# Altium schematic symbol library jlcpcb_2025_04_capacitors_extended_0603.schlib: 3668 symbols (part 16 of 20)
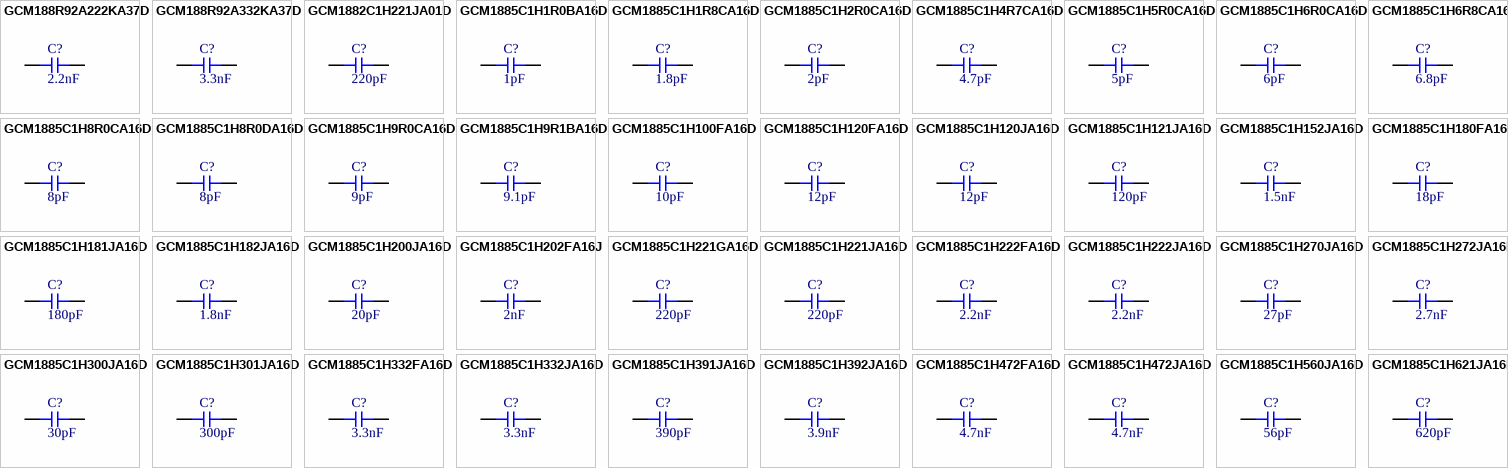
[diagram p106: symbols GCM188R92A222KA37D to GCM1885C1H621JA16D]

## GCM1885C1H152JA16D
designator C?  Capacitance: 1.5nF  (hidden comment: *)
Capacitor, Ceramic (MLCC), 1.5nF, ±5%, 50V, C0G, ±5%, SMD 0603; Manufacturer: Murata Electronics; Manufacturer Part Number: GCM1885C1H152JA16D; Package Size: 0603; JLCPCB Basic Part: No; JLCPCB Part Number: C161174; Supplier 1: LCSC; Category: Capacitors - MLCC; Supplier Part Number 1: C161174; Tolerance: ±5%; Voltage Rating: 50V; Temperature Coefficient: C0G; RoHS: Yes; ComponentLink1Description: Datasheet; ComponentLink1URL: https://wmsc.lcsc.com/wmsc/upload/file/pdf/v2/lcsc/1810311136_Murata-Electronics-GCM1885C1H152JA16D_C161174.pdf; ComponentLink2Description: JLCPCB Part URL; ComponentLink2URL: https://jlcpcb.com/partdetail/C161174; ComponentLink3Description: LCSC Part URL; ComponentLink3URL: https://lcsc.com/product-detail/Multilayer-Ceramic-Capacitors-MLCC---SMD-SMT_Murata-Electronics-Murata-Electronics-GCM1885C1H152JA16D_C161174.html
footprint CAP-0603 (0603 (1608M) Capacitor)
pins: 1, 2

## GCM1885C1H180FA16D
designator C?  Capacitance: 18pF  (hidden comment: *)
Capacitor, Ceramic (MLCC), 18pF, ±1%, 50V, C0G, ±1%, SMD 0603; Manufacturer: Murata Electronics; Manufacturer Part Number: GCM1885C1H180FA16D; Package Size: 0603; JLCPCB Basic Part: No; JLCPCB Part Number: C126551; Supplier 1: LCSC; Category: Capacitors - MLCC; Supplier Part Number 1: C126551; Tolerance: ±1%; Voltage Rating: 50V; Temperature Coefficient: C0G; RoHS: Yes; ComponentLink1Description: Datasheet; ComponentLink1URL: https://wmsc.lcsc.com/wmsc/upload/file/pdf/v2/lcsc/1810311141_Murata-Electronics-GCM1885C1H180FA16D_C126551.pdf; ComponentLink2Description: JLCPCB Part URL; ComponentLink2URL: https://jlcpcb.com/partdetail/C126551; ComponentLink3Description: LCSC Part URL; ComponentLink3URL: https://lcsc.com/product-detail/Multilayer-Ceramic-Capacitors-MLCC---SMD-SMT_Murata-Electronics-Murata-Electronics-GCM1885C1H180FA16D_C126551.html
footprint CAP-0603 (0603 (1608M) Capacitor)
pins: 1, 2

## GCM1885C1H181JA16D
designator C?  Capacitance: 180pF  (hidden comment: *)
Capacitor, Ceramic (MLCC), 180pF, ±5%, 50V, C0G, ±5%, SMD 0603; Manufacturer: Murata Electronics; Manufacturer Part Number: GCM1885C1H181JA16D; Package Size: 0603; JLCPCB Basic Part: No; JLCPCB Part Number: C440147; Supplier 1: LCSC; Category: Capacitors - MLCC; Supplier Part Number 1: C440147; Tolerance: ±5%; Voltage Rating: 50V; Temperature Coefficient: C0G; RoHS: Yes; ComponentLink1Description: Datasheet; ComponentLink1URL: https://wmsc.lcsc.com/wmsc/upload/file/pdf/v2/lcsc/2304140030_Murata-Electronics-GCM1885C1H181JA16D_C440147.pdf; ComponentLink2Description: JLCPCB Part URL; ComponentLink2URL: https://jlcpcb.com/partdetail/C440147; ComponentLink3Description: LCSC Part URL; ComponentLink3URL: https://lcsc.com/product-detail/Multilayer-Ceramic-Capacitors-MLCC---SMD-SMT_Murata-Electronics-Murata-Electronics-GCM1885C1H181JA16D_C440147.html
footprint CAP-0603 (0603 (1608M) Capacitor)
pins: 1, 2

## GCM1885C1H182JA16D
designator C?  Capacitance: 1.8nF  (hidden comment: *)
Capacitor, Ceramic (MLCC), 1.8nF, ±5%, 50V, C0G, ±5%, SMD 0603; Manufacturer: Murata Electronics; Manufacturer Part Number: GCM1885C1H182JA16D; Package Size: 0603; JLCPCB Basic Part: No; JLCPCB Part Number: C437450; Supplier 1: LCSC; Category: Capacitors - MLCC; Supplier Part Number 1: C437450; Tolerance: ±5%; Voltage Rating: 50V; Temperature Coefficient: C0G; RoHS: Yes; ComponentLink1Description: Datasheet; ComponentLink1URL: https://wmsc.lcsc.com/wmsc/upload/file/pdf/v2/lcsc/2304140030_Murata-Electronics-GCM1885C1H182JA16D_C437450.pdf; ComponentLink2Description: JLCPCB Part URL; ComponentLink2URL: https://jlcpcb.com/partdetail/C437450; ComponentLink3Description: LCSC Part URL; ComponentLink3URL: https://lcsc.com/product-detail/Multilayer-Ceramic-Capacitors-MLCC---SMD-SMT_Murata-Electronics-Murata-Electronics-GCM1885C1H182JA16D_C437450.html
footprint CAP-0603 (0603 (1608M) Capacitor)
pins: 1, 2

## GCM1885C1H200JA16D
designator C?  Capacitance: 20pF  (hidden comment: *)
Capacitor, Ceramic (MLCC), 20pF, ±5%, 50V, C0G, ±5%, SMD 0603; Manufacturer: Murata Electronics; Manufacturer Part Number: GCM1885C1H200JA16D; Package Size: 0603; JLCPCB Basic Part: No; JLCPCB Part Number: C126554; Supplier 1: LCSC; Category: Capacitors - MLCC; Supplier Part Number 1: C126554; Tolerance: ±5%; Voltage Rating: 50V; Temperature Coefficient: C0G; RoHS: Yes; ComponentLink1Description: Datasheet; ComponentLink1URL: https://wmsc.lcsc.com/wmsc/upload/file/pdf/v2/lcsc/1810311120_Murata-Electronics-GCM1885C1H200JA16D_C126554.pdf; ComponentLink2Description: JLCPCB Part URL; ComponentLink2URL: https://jlcpcb.com/partdetail/C126554; ComponentLink3Description: LCSC Part URL; ComponentLink3URL: https://lcsc.com/product-detail/Multilayer-Ceramic-Capacitors-MLCC---SMD-SMT_Murata-Electronics-Murata-Electronics-GCM1885C1H200JA16D_C126554.html
footprint CAP-0603 (0603 (1608M) Capacitor)
pins: 1, 2

## GCM1885C1H202FA16J
designator C?  Capacitance: 2nF  (hidden comment: *)
Capacitor, Ceramic (MLCC), 2nF, ±1%, 50V, C0G, ±1%, SMD 0603; Manufacturer: Murata Electronics; Manufacturer Part Number: GCM1885C1H202FA16J; Package Size: 0603; JLCPCB Basic Part: No; JLCPCB Part Number: C1870141; Supplier 1: LCSC; Category: Capacitors - MLCC; Supplier Part Number 1: C1870141; Tolerance: ±1%; Voltage Rating: 50V; Temperature Coefficient: C0G; RoHS: Yes; ComponentLink1Description: Datasheet; ComponentLink1URL: https://wmsc.lcsc.com/wmsc/upload/file/pdf/v2/lcsc/2201272330_Murata-Electronics-GCM1885C1H202FA16J_C1870141.pdf; ComponentLink2Description: JLCPCB Part URL; ComponentLink2URL: https://jlcpcb.com/partdetail/C1870141; ComponentLink3Description: LCSC Part URL; ComponentLink3URL: https://lcsc.com/product-detail/Multilayer-Ceramic-Capacitors-MLCC---SMD-SMT_Murata-Electronics-Murata-Electronics-GCM1885C1H202FA16J_C1870141.html
footprint CAP-0603 (0603 (1608M) Capacitor)
pins: 1, 2

## GCM1885C1H221GA16D
designator C?  Capacitance: 220pF  (hidden comment: *)
Capacitor, Ceramic (MLCC), 220pF, ±2%, 50V, C0G, ±2%, SMD 0603; Manufacturer: Murata Electronics; Manufacturer Part Number: GCM1885C1H221GA16D; Package Size: 0603; JLCPCB Basic Part: No; JLCPCB Part Number: C437452; Supplier 1: LCSC; Category: Capacitors - MLCC; Supplier Part Number 1: C437452; Tolerance: ±2%; Voltage Rating: 50V; Temperature Coefficient: C0G; RoHS: Yes; ComponentLink1Description: Datasheet; ComponentLink1URL: https://wmsc.lcsc.com/wmsc/upload/file/pdf/v2/lcsc/2304140030_Murata-Electronics-GCM1885C1H221GA16D_C437452.pdf; ComponentLink2Description: JLCPCB Part URL; ComponentLink2URL: https://jlcpcb.com/partdetail/C437452; ComponentLink3Description: LCSC Part URL; ComponentLink3URL: https://lcsc.com/product-detail/Multilayer-Ceramic-Capacitors-MLCC---SMD-SMT_Murata-Electronics-Murata-Electronics-GCM1885C1H221GA16D_C437452.html
footprint CAP-0603 (0603 (1608M) Capacitor)
pins: 1, 2

## GCM1885C1H221JA16D
designator C?  Capacitance: 220pF  (hidden comment: *)
Capacitor, Ceramic (MLCC), 220pF, ±5%, 50V, C0G, ±5%, SMD 0603; Manufacturer: Murata Electronics; Manufacturer Part Number: GCM1885C1H221JA16D; Package Size: 0603; JLCPCB Basic Part: No; JLCPCB Part Number: C126556; Supplier 1: LCSC; Category: Capacitors - MLCC; Supplier Part Number 1: C126556; Tolerance: ±5%; Voltage Rating: 50V; Temperature Coefficient: C0G; RoHS: Yes; ComponentLink1Description: Datasheet; ComponentLink1URL: https://wmsc.lcsc.com/wmsc/upload/file/pdf/v2/lcsc/1810311134_Murata-Electronics-GCM1885C1H221JA16D_C126556.pdf; ComponentLink2Description: JLCPCB Part URL; ComponentLink2URL: https://jlcpcb.com/partdetail/C126556; ComponentLink3Description: LCSC Part URL; ComponentLink3URL: https://lcsc.com/product-detail/Multilayer-Ceramic-Capacitors-MLCC---SMD-SMT_Murata-Electronics-Murata-Electronics-GCM1885C1H221JA16D_C126556.html
footprint CAP-0603 (0603 (1608M) Capacitor)
pins: 1, 2

## GCM1885C1H222FA16D
designator C?  Capacitance: 2.2nF  (hidden comment: *)
Capacitor, Ceramic (MLCC), 2.2nF, ±1%, null, ±1%, SMD 0603; Manufacturer: Murata Electronics; Manufacturer Part Number: GCM1885C1H222FA16D; Package Size: 0603; JLCPCB Basic Part: No; JLCPCB Part Number: C882578; Supplier 1: LCSC; Category: Capacitors - MLCC; Supplier Part Number 1: C882578; Tolerance: ±1%; Voltage Rating: null; RoHS: Yes; ComponentLink1Description: Datasheet; ComponentLink1URL: https://wmsc.lcsc.com/wmsc/upload/file/pdf/v2/lcsc/2201242130_Murata-Electronics-GCM1885C1H222FA16D_C882578.pdf; ComponentLink2Description: JLCPCB Part URL; ComponentLink2URL: https://jlcpcb.com/partdetail/C882578; ComponentLink3Description: LCSC Part URL; ComponentLink3URL: https://lcsc.com/product-detail/Multilayer-Ceramic-Capacitors-MLCC---SMD-SMT_Murata-Electronics-Murata-Electronics-GCM1885C1H222FA16D_C882578.html
footprint CAP-0603 (0603 (1608M) Capacitor)
pins: 1, 2

## GCM1885C1H222JA16D
designator C?  Capacitance: 2.2nF  (hidden comment: *)
Capacitor, Ceramic (MLCC), 2.2nF, ±5%, 50V, C0G, ±5%, SMD 0603; Manufacturer: Murata Electronics; Manufacturer Part Number: GCM1885C1H222JA16D; Package Size: 0603; JLCPCB Basic Part: No; JLCPCB Part Number: C343869; Supplier 1: LCSC; Category: Capacitors - MLCC; Supplier Part Number 1: C343869; Tolerance: ±5%; Voltage Rating: 50V; Temperature Coefficient: C0G; RoHS: Yes; ComponentLink1Description: Datasheet; ComponentLink1URL: https://wmsc.lcsc.com/wmsc/upload/file/pdf/v2/lcsc/1912111437_Murata-Electronics-GCM1885C1H222JA16D_C343869.pdf; ComponentLink2Description: JLCPCB Part URL; ComponentLink2URL: https://jlcpcb.com/partdetail/C343869; ComponentLink3Description: LCSC Part URL; ComponentLink3URL: https://lcsc.com/product-detail/Multilayer-Ceramic-Capacitors-MLCC---SMD-SMT_Murata-Electronics-Murata-Electronics-GCM1885C1H222JA16D_C343869.html
footprint CAP-0603 (0603 (1608M) Capacitor)
pins: 1, 2

## GCM1885C1H270JA16D
designator C?  Capacitance: 27pF  (hidden comment: *)
Capacitor, Ceramic (MLCC), 27pF, ±5%, 50V, C0G, ±5%, SMD 0603; Manufacturer: Murata Electronics; Manufacturer Part Number: GCM1885C1H270JA16D; Package Size: 0603; JLCPCB Basic Part: No; JLCPCB Part Number: C126558; Supplier 1: LCSC; Category: Capacitors - MLCC; Supplier Part Number 1: C126558; Tolerance: ±5%; Voltage Rating: 50V; Temperature Coefficient: C0G; RoHS: Yes; ComponentLink1Description: Datasheet; ComponentLink1URL: https://wmsc.lcsc.com/wmsc/upload/file/pdf/v2/lcsc/1810311141_Murata-Electronics-GCM1885C1H270JA16D_C126558.pdf; ComponentLink2Description: JLCPCB Part URL; ComponentLink2URL: https://jlcpcb.com/partdetail/C126558; ComponentLink3Description: LCSC Part URL; ComponentLink3URL: https://lcsc.com/product-detail/Multilayer-Ceramic-Capacitors-MLCC---SMD-SMT_Murata-Electronics-Murata-Electronics-GCM1885C1H270JA16D_C126558.html
footprint CAP-0603 (0603 (1608M) Capacitor)
pins: 1, 2

## GCM1885C1H272JA16D
designator C?  Capacitance: 2.7nF  (hidden comment: *)
Capacitor, Ceramic (MLCC), 2.7nF, ±5%, 50V, C0G, ±5%, SMD 0603; Manufacturer: Murata Electronics; Manufacturer Part Number: GCM1885C1H272JA16D; Package Size: 0603; JLCPCB Basic Part: No; JLCPCB Part Number: C437453; Supplier 1: LCSC; Category: Capacitors - MLCC; Supplier Part Number 1: C437453; Tolerance: ±5%; Voltage Rating: 50V; Temperature Coefficient: C0G; RoHS: Yes; ComponentLink1Description: Datasheet; ComponentLink1URL: https://wmsc.lcsc.com/wmsc/upload/file/pdf/v2/lcsc/2304140030_Murata-Electronics-GCM1885C1H272JA16D_C437453.pdf; ComponentLink2Description: JLCPCB Part URL; ComponentLink2URL: https://jlcpcb.com/partdetail/C437453; ComponentLink3Description: LCSC Part URL; ComponentLink3URL: https://lcsc.com/product-detail/Multilayer-Ceramic-Capacitors-MLCC---SMD-SMT_Murata-Electronics-Murata-Electronics-GCM1885C1H272JA16D_C437453.html
footprint CAP-0603 (0603 (1608M) Capacitor)
pins: 1, 2

## GCM1885C1H300JA16D
designator C?  Capacitance: 30pF  (hidden comment: *)
Capacitor, Ceramic (MLCC), 30pF, ±5%, 50V, C0G, ±5%, SMD 0603; Manufacturer: Murata Electronics; Manufacturer Part Number: GCM1885C1H300JA16D; Package Size: 0603; JLCPCB Basic Part: No; JLCPCB Part Number: C425878; Supplier 1: LCSC; Category: Capacitors - MLCC; Supplier Part Number 1: C425878; Tolerance: ±5%; Voltage Rating: 50V; Temperature Coefficient: C0G; RoHS: Yes; ComponentLink1Description: Datasheet; ComponentLink1URL: https://wmsc.lcsc.com/wmsc/upload/file/pdf/v2/lcsc/1912111437_Murata-Electronics-GCM1885C1H300JA16D_C425878.pdf; ComponentLink2Description: JLCPCB Part URL; ComponentLink2URL: https://jlcpcb.com/partdetail/C425878; ComponentLink3Description: LCSC Part URL; ComponentLink3URL: https://lcsc.com/product-detail/Multilayer-Ceramic-Capacitors-MLCC---SMD-SMT_Murata-Electronics-Murata-Electronics-GCM1885C1H300JA16D_C425878.html
footprint CAP-0603 (0603 (1608M) Capacitor)
pins: 1, 2

## GCM1885C1H301JA16D
designator C?  Capacitance: 300pF  (hidden comment: *)
Capacitor, Ceramic (MLCC), 300pF, ±5%, null, ±5%, SMD 0603; Manufacturer: Murata Electronics; Manufacturer Part Number: GCM1885C1H301JA16D; Package Size: 0603; JLCPCB Basic Part: No; JLCPCB Part Number: C913766; Supplier 1: LCSC; Category: Capacitors - MLCC; Supplier Part Number 1: C913766; Tolerance: ±5%; Voltage Rating: null; RoHS: Yes; ComponentLink1Description: Datasheet; ComponentLink1URL: https://wmsc.lcsc.com/wmsc/upload/file/pdf/v2/lcsc/2308111602_Murata-Electronics-GCM1885C1H301JA16D_C913766.pdf; ComponentLink2Description: JLCPCB Part URL; ComponentLink2URL: https://jlcpcb.com/partdetail/C913766; ComponentLink3Description: LCSC Part URL; ComponentLink3URL: https://lcsc.com/product-detail/Multilayer-Ceramic-Capacitors-MLCC---SMD-SMT_Murata-Electronics-Murata-Electronics-GCM1885C1H301JA16D_C913766.html
footprint CAP-0603 (0603 (1608M) Capacitor)
pins: 1, 2

## GCM1885C1H332FA16D
designator C?  Capacitance: 3.3nF  (hidden comment: *)
Capacitor, Ceramic (MLCC), 3.3nF, 50V, C0G, SMD 0603; Manufacturer: Murata Electronics; Manufacturer Part Number: GCM1885C1H332FA16D; Package Size: 0603; JLCPCB Basic Part: No; JLCPCB Part Number: C3877267; Supplier 1: LCSC; Category: Capacitors - MLCC; Supplier Part Number 1: C3877267; Voltage Rating: 50V; Temperature Coefficient: C0G; RoHS: Yes; ComponentLink1Description: Datasheet; ComponentLink1URL: https://wmsc.lcsc.com/wmsc/upload/file/pdf/v2/lcsc/2308111756_Murata-Electronics-GCM1885C1H332FA16D_C3877267.pdf; ComponentLink2Description: JLCPCB Part URL; ComponentLink2URL: https://jlcpcb.com/partdetail/C3877267; ComponentLink3Description: LCSC Part URL; ComponentLink3URL: https://lcsc.com/product-detail/Multilayer-Ceramic-Capacitors-MLCC---SMD-SMT_Murata-Electronics-Murata-Electronics-GCM1885C1H332FA16D_C3877267.html
footprint CAP-0603 (0603 (1608M) Capacitor)
pins: 1, 2

## GCM1885C1H332JA16D
designator C?  Capacitance: 3.3nF  (hidden comment: *)
Capacitor, Ceramic (MLCC), 3.3nF, ±5%, 50V, C0G, ±5%, SMD 0603; Manufacturer: Murata Electronics; Manufacturer Part Number: GCM1885C1H332JA16D; Package Size: 0603; JLCPCB Basic Part: No; JLCPCB Part Number: C161178; Supplier 1: LCSC; Category: Capacitors - MLCC; Supplier Part Number 1: C161178; Tolerance: ±5%; Voltage Rating: 50V; Temperature Coefficient: C0G; RoHS: Yes; ComponentLink1Description: Datasheet; ComponentLink1URL: https://wmsc.lcsc.com/wmsc/upload/file/pdf/v2/lcsc/1810311133_Murata-Electronics-GCM1885C1H332JA16D_C161178.pdf; ComponentLink2Description: JLCPCB Part URL; ComponentLink2URL: https://jlcpcb.com/partdetail/C161178; ComponentLink3Description: LCSC Part URL; ComponentLink3URL: https://lcsc.com/product-detail/Multilayer-Ceramic-Capacitors-MLCC---SMD-SMT_Murata-Electronics-Murata-Electronics-GCM1885C1H332JA16D_C161178.html
footprint CAP-0603 (0603 (1608M) Capacitor)
pins: 1, 2

## GCM1885C1H391JA16D
designator C?  Capacitance: 390pF  (hidden comment: *)
Capacitor, Ceramic (MLCC), 390pF, ±5%, 50V, ±5%, SMD 0603; Manufacturer: Murata Electronics; Manufacturer Part Number: GCM1885C1H391JA16D; Package Size: 0603; JLCPCB Basic Part: No; JLCPCB Part Number: C126564; Supplier 1: LCSC; Category: Capacitors - MLCC; Supplier Part Number 1: C126564; Tolerance: ±5%; Voltage Rating: 50V; RoHS: Yes; ComponentLink1Description: Datasheet; ComponentLink1URL: https://wmsc.lcsc.com/wmsc/upload/file/pdf/v2/lcsc/2201242300_Murata-Electronics-GCM1885C1H391JA16D_C126564.pdf; ComponentLink2Description: JLCPCB Part URL; ComponentLink2URL: https://jlcpcb.com/partdetail/C126564; ComponentLink3Description: LCSC Part URL; ComponentLink3URL: https://lcsc.com/product-detail/Multilayer-Ceramic-Capacitors-MLCC---SMD-SMT_Murata-Electronics-Murata-Electronics-GCM1885C1H391JA16D_C126564.html
footprint CAP-0603 (0603 (1608M) Capacitor)
pins: 1, 2

## GCM1885C1H392JA16D
designator C?  Capacitance: 3.9nF  (hidden comment: *)
Capacitor, Ceramic (MLCC), 3.9nF, ±5%, 50V, ±5%, SMD 0603; Manufacturer: Murata Electronics; Manufacturer Part Number: GCM1885C1H392JA16D; Package Size: 0603; JLCPCB Basic Part: No; JLCPCB Part Number: C2169349; Supplier 1: LCSC; Category: Capacitors - MLCC; Supplier Part Number 1: C2169349; Tolerance: ±5%; Voltage Rating: 50V; RoHS: Yes; ComponentLink1Description: Datasheet; ComponentLink1URL: https://wmsc.lcsc.com/wmsc/upload/file/pdf/v2/lcsc/2308111602_Murata-Electronics-GCM1885C1H392JA16D_C2169349.pdf; ComponentLink2Description: JLCPCB Part URL; ComponentLink2URL: https://jlcpcb.com/partdetail/C2169349; ComponentLink3Description: LCSC Part URL; ComponentLink3URL: https://lcsc.com/product-detail/Multilayer-Ceramic-Capacitors-MLCC---SMD-SMT_Murata-Electronics-Murata-Electronics-GCM1885C1H392JA16D_C2169349.html
footprint CAP-0603 (0603 (1608M) Capacitor)
pins: 1, 2

## GCM1885C1H472FA16D
designator C?  Capacitance: 4.7nF  (hidden comment: *)
Capacitor, Ceramic (MLCC), 4.7nF, ±1%, ±1%, SMD 0603; Manufacturer: Murata Electronics; Manufacturer Part Number: GCM1885C1H472FA16D; Package Size: 0603; JLCPCB Basic Part: No; JLCPCB Part Number: C883564; Supplier 1: LCSC; Category: Capacitors - MLCC; Supplier Part Number 1: C883564; Tolerance: ±1%; RoHS: Yes; ComponentLink1Description: Datasheet; ComponentLink1URL: https://wmsc.lcsc.com/wmsc/upload/file/pdf/v2/lcsc/2304140030_Murata-Electronics-GCM1885C1H472FA16D_C883564.pdf; ComponentLink2Description: JLCPCB Part URL; ComponentLink2URL: https://jlcpcb.com/partdetail/C883564; ComponentLink3Description: LCSC Part URL; ComponentLink3URL: https://lcsc.com/product-detail/Multilayer-Ceramic-Capacitors-MLCC---SMD-SMT_Murata-Electronics-Murata-Electronics-GCM1885C1H472FA16D_C883564.html
footprint CAP-0603 (0603 (1608M) Capacitor)
pins: 1, 2

## GCM1885C1H472JA16D
designator C?  Capacitance: 4.7nF  (hidden comment: *)
Capacitor, Ceramic (MLCC), 4.7nF, ±5%, 50V, C0G, ±5%, SMD 0603; Manufacturer: Murata Electronics; Manufacturer Part Number: GCM1885C1H472JA16D; Package Size: 0603; JLCPCB Basic Part: No; JLCPCB Part Number: C343870; Supplier 1: LCSC; Category: Capacitors - MLCC; Supplier Part Number 1: C343870; Tolerance: ±5%; Voltage Rating: 50V; Temperature Coefficient: C0G; RoHS: Yes; ComponentLink1Description: Datasheet; ComponentLink1URL: https://wmsc.lcsc.com/wmsc/upload/file/pdf/v2/lcsc/2208111730_Murata-Electronics-GCM1885C1H472JA16D_C343870.pdf; ComponentLink2Description: JLCPCB Part URL; ComponentLink2URL: https://jlcpcb.com/partdetail/C343870; ComponentLink3Description: LCSC Part URL; ComponentLink3URL: https://lcsc.com/product-detail/Multilayer-Ceramic-Capacitors-MLCC---SMD-SMT_Murata-Electronics-Murata-Electronics-GCM1885C1H472JA16D_C343870.html
footprint CAP-0603 (0603 (1608M) Capacitor)
pins: 1, 2

## GCM1885C1H560JA16D
designator C?  Capacitance: 56pF  (hidden comment: *)
Capacitor, Ceramic (MLCC), 56pF, ±5%, 50V, C0G, ±5%, SMD 0603; Manufacturer: Murata Electronics; Manufacturer Part Number: GCM1885C1H560JA16D; Package Size: 0603; JLCPCB Basic Part: No; JLCPCB Part Number: C126568; Supplier 1: LCSC; Category: Capacitors - MLCC; Supplier Part Number 1: C126568; Tolerance: ±5%; Voltage Rating: 50V; Temperature Coefficient: C0G; RoHS: Yes; ComponentLink1Description: Datasheet; ComponentLink1URL: https://wmsc.lcsc.com/wmsc/upload/file/pdf/v2/lcsc/1912111437_Murata-Electronics-GCM1885C1H560JA16D_C126568.pdf; ComponentLink2Description: JLCPCB Part URL; ComponentLink2URL: https://jlcpcb.com/partdetail/C126568; ComponentLink3Description: LCSC Part URL; ComponentLink3URL: https://lcsc.com/product-detail/Multilayer-Ceramic-Capacitors-MLCC---SMD-SMT_Murata-Electronics-Murata-Electronics-GCM1885C1H560JA16D_C126568.html
footprint CAP-0603 (0603 (1608M) Capacitor)
pins: 1, 2

## GCM1885C1H621JA16D
designator C?  Capacitance: 620pF  (hidden comment: *)
Capacitor, Ceramic (MLCC), 620pF, ±5%, 50V, C0G, ±5%, SMD 0603; Manufacturer: Murata Electronics; Manufacturer Part Number: GCM1885C1H621JA16D; Package Size: 0603; JLCPCB Basic Part: No; JLCPCB Part Number: C126569; Supplier 1: LCSC; Category: Capacitors - MLCC; Supplier Part Number 1: C126569; Tolerance: ±5%; Voltage Rating: 50V; Temperature Coefficient: C0G; RoHS: Yes; ComponentLink1Description: Datasheet; ComponentLink1URL: https://wmsc.lcsc.com/wmsc/upload/file/pdf/v2/lcsc/1811141813_Murata-Electronics-GCM1885C1H621JA16D_C126569.pdf; ComponentLink2Description: JLCPCB Part URL; ComponentLink2URL: https://jlcpcb.com/partdetail/C126569; ComponentLink3Description: LCSC Part URL; ComponentLink3URL: https://lcsc.com/product-detail/Multilayer-Ceramic-Capacitors-MLCC---SMD-SMT_Murata-Electronics-Murata-Electronics-GCM1885C1H621JA16D_C126569.html
footprint CAP-0603 (0603 (1608M) Capacitor)
pins: 1, 2

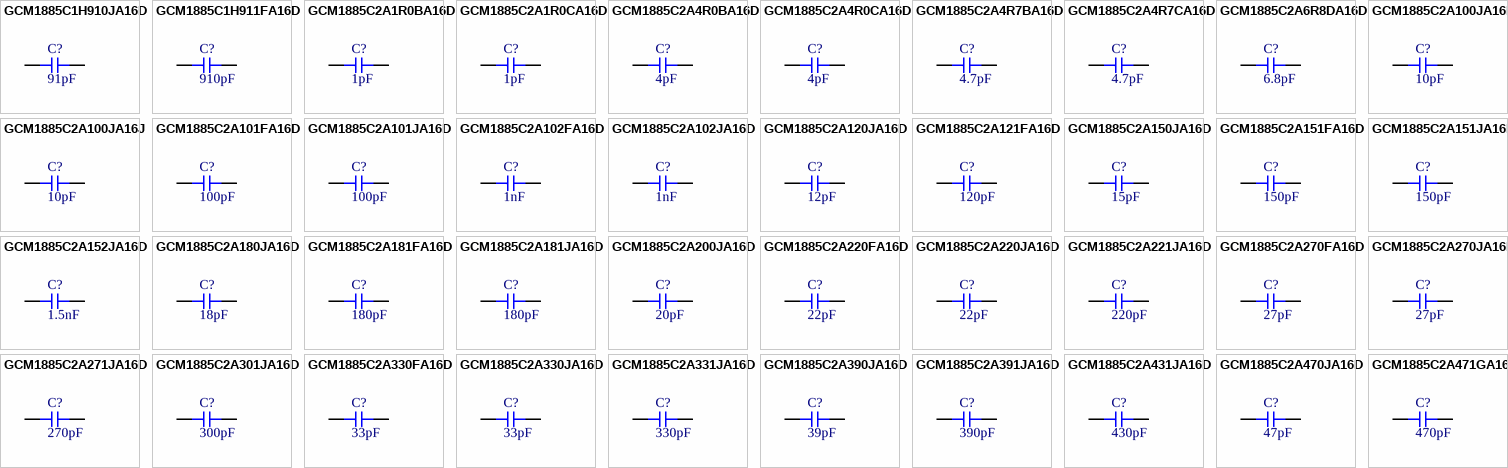
[diagram p70: symbols GCM1885C1H910JA16D to GCM1885C2A471GA16D]

## GCM1885C1H910JA16D
designator C?  Capacitance: 91pF  (hidden comment: *)
Capacitor, Ceramic (MLCC), 91pF, ±5%, null, ±5%, SMD 0603; Manufacturer: Murata Electronics; Manufacturer Part Number: GCM1885C1H910JA16D; Package Size: 0603; JLCPCB Basic Part: No; JLCPCB Part Number: C782042; Supplier 1: LCSC; Category: Capacitors - MLCC; Supplier Part Number 1: C782042; Tolerance: ±5%; Voltage Rating: null; RoHS: Yes; ComponentLink1Description: Datasheet; ComponentLink1URL: https://wmsc.lcsc.com/wmsc/upload/file/pdf/v2/lcsc/2304140030_Murata-Electronics-GCM1885C1H910JA16D_C782042.pdf; ComponentLink2Description: JLCPCB Part URL; ComponentLink2URL: https://jlcpcb.com/partdetail/C782042; ComponentLink3Description: LCSC Part URL; ComponentLink3URL: https://lcsc.com/product-detail/Multilayer-Ceramic-Capacitors-MLCC---SMD-SMT_Murata-Electronics-Murata-Electronics-GCM1885C1H910JA16D_C782042.html
footprint CAP-0603 (0603 (1608M) Capacitor)
pins: 1, 2

## GCM1885C1H911FA16D
designator C?  Capacitance: 910pF  (hidden comment: *)
Capacitor, Ceramic (MLCC), 910pF, ±1%, 50V, ±1%, SMD 0603; Manufacturer: Murata Electronics; Manufacturer Part Number: GCM1885C1H911FA16D; Package Size: 0603; JLCPCB Basic Part: No; JLCPCB Part Number: C883580; Supplier 1: LCSC; Category: Capacitors - MLCC; Supplier Part Number 1: C883580; Tolerance: ±1%; Voltage Rating: 50V; RoHS: Yes; ComponentLink1Description: Datasheet; ComponentLink1URL: https://wmsc.lcsc.com/wmsc/upload/file/pdf/v2/lcsc/2304140030_Murata-Electronics-GCM1885C1H911FA16D_C883580.pdf; ComponentLink2Description: JLCPCB Part URL; ComponentLink2URL: https://jlcpcb.com/partdetail/C883580; ComponentLink3Description: LCSC Part URL; ComponentLink3URL: https://lcsc.com/product-detail/Multilayer-Ceramic-Capacitors-MLCC---SMD-SMT_Murata-Electronics-Murata-Electronics-GCM1885C1H911FA16D_C883580.html
footprint CAP-0603 (0603 (1608M) Capacitor)
pins: 1, 2

## GCM1885C2A1R0BA16D
designator C?  Capacitance: 1pF  (hidden comment: *)
Capacitor, Ceramic (MLCC), 1pF, 100V, C0G, SMD 0603; Manufacturer: Murata Electronics; Manufacturer Part Number: GCM1885C2A1R0BA16D; Package Size: 0603; JLCPCB Basic Part: No; JLCPCB Part Number: C1864706; Supplier 1: LCSC; Category: Capacitors - MLCC; Supplier Part Number 1: C1864706; Voltage Rating: 100V; Temperature Coefficient: C0G; RoHS: Yes; ComponentLink1Description: Datasheet; ComponentLink1URL: https://wmsc.lcsc.com/wmsc/upload/file/pdf/v2/lcsc/2201271830_Murata-Electronics-GCM1885C2A1R0BA16D_C1864706.pdf; ComponentLink2Description: JLCPCB Part URL; ComponentLink2URL: https://jlcpcb.com/partdetail/C1864706; ComponentLink3Description: LCSC Part URL; ComponentLink3URL: https://lcsc.com/product-detail/Multilayer-Ceramic-Capacitors-MLCC---SMD-SMT_Murata-Electronics-Murata-Electronics-GCM1885C2A1R0BA16D_C1864706.html
footprint CAP-0603 (0603 (1608M) Capacitor)
pins: 1, 2

## GCM1885C2A1R0CA16D
designator C?  Capacitance: 1pF  (hidden comment: *)
Capacitor, Ceramic (MLCC), 1pF, 100V, C0G, SMD 0603; Manufacturer: Murata Electronics; Manufacturer Part Number: GCM1885C2A1R0CA16D; Package Size: 0603; JLCPCB Basic Part: No; JLCPCB Part Number: C354358; Supplier 1: LCSC; Category: Capacitors - MLCC; Supplier Part Number 1: C354358; Voltage Rating: 100V; Temperature Coefficient: C0G; RoHS: Yes; ComponentLink1Description: Datasheet; ComponentLink1URL: https://wmsc.lcsc.com/wmsc/upload/file/pdf/v2/lcsc/1912111437_Murata-Electronics-GCM1885C2A1R0CA16D_C354358.pdf; ComponentLink2Description: JLCPCB Part URL; ComponentLink2URL: https://jlcpcb.com/partdetail/C354358; ComponentLink3Description: LCSC Part URL; ComponentLink3URL: https://lcsc.com/product-detail/Multilayer-Ceramic-Capacitors-MLCC---SMD-SMT_Murata-Electronics-Murata-Electronics-GCM1885C2A1R0CA16D_C354358.html
footprint CAP-0603 (0603 (1608M) Capacitor)
pins: 1, 2

## GCM1885C2A4R0BA16D
designator C?  Capacitance: 4pF  (hidden comment: *)
Capacitor, Ceramic (MLCC), 4pF, 100V, C0G, SMD 0603; Manufacturer: Murata Electronics; Manufacturer Part Number: GCM1885C2A4R0BA16D; Package Size: 0603; JLCPCB Basic Part: No; JLCPCB Part Number: C5143542; Supplier 1: LCSC; Category: Capacitors - MLCC; Supplier Part Number 1: C5143542; Voltage Rating: 100V; Temperature Coefficient: C0G; RoHS: Yes; ComponentLink1Description: Datasheet; ComponentLink1URL: https://wmsc.lcsc.com/wmsc/upload/file/pdf/v2/lcsc/2208241730_Murata-Electronics-GCM1885C2A4R0BA16D_C5143542.pdf; ComponentLink2Description: JLCPCB Part URL; ComponentLink2URL: https://jlcpcb.com/partdetail/C5143542; ComponentLink3Description: LCSC Part URL; ComponentLink3URL: https://lcsc.com/product-detail/Multilayer-Ceramic-Capacitors-MLCC---SMD-SMT_Murata-Electronics-Murata-Electronics-GCM1885C2A4R0BA16D_C5143542.html
footprint CAP-0603 (0603 (1608M) Capacitor)
pins: 1, 2

## GCM1885C2A4R0CA16D
designator C?  Capacitance: 4pF  (hidden comment: *)
Capacitor, Ceramic (MLCC), 4pF, 100V, SMD 0603; Manufacturer: Murata Electronics; Manufacturer Part Number: GCM1885C2A4R0CA16D; Package Size: 0603; JLCPCB Basic Part: No; JLCPCB Part Number: C2210302; Supplier 1: LCSC; Category: Capacitors - MLCC; Supplier Part Number 1: C2210302; Voltage Rating: 100V; RoHS: Yes; ComponentLink1Description: Datasheet; ComponentLink1URL: https://wmsc.lcsc.com/wmsc/upload/file/pdf/v2/lcsc/2401272130_Murata-Electronics-GCM1885C2A4R0CA16D_C2210302.pdf; ComponentLink2Description: JLCPCB Part URL; ComponentLink2URL: https://jlcpcb.com/partdetail/C2210302; ComponentLink3Description: LCSC Part URL; ComponentLink3URL: https://lcsc.com/product-detail/Multilayer-Ceramic-Capacitors-MLCC---SMD-SMT_Murata-Electronics-Murata-Electronics-GCM1885C2A4R0CA16D_C2210302.html
footprint CAP-0603 (0603 (1608M) Capacitor)
pins: 1, 2

## GCM1885C2A4R7BA16D
designator C?  Capacitance: 4.7pF  (hidden comment: *)
Capacitor, Ceramic (MLCC), 4.7pF, 100V, C0G, SMD 0603; Manufacturer: Murata Electronics; Manufacturer Part Number: GCM1885C2A4R7BA16D; Package Size: 0603; JLCPCB Basic Part: No; JLCPCB Part Number: C3832723; Supplier 1: LCSC; Category: Capacitors - MLCC; Supplier Part Number 1: C3832723; Voltage Rating: 100V; Temperature Coefficient: C0G; RoHS: Yes; ComponentLink1Description: Datasheet; ComponentLink1URL: https://wmsc.lcsc.com/wmsc/upload/file/pdf/v2/lcsc/2308111741_Murata-Electronics-GCM1885C2A4R7BA16D_C3832723.pdf; ComponentLink2Description: JLCPCB Part URL; ComponentLink2URL: https://jlcpcb.com/partdetail/C3832723; ComponentLink3Description: LCSC Part URL; ComponentLink3URL: https://lcsc.com/product-detail/Multilayer-Ceramic-Capacitors-MLCC---SMD-SMT_Murata-Electronics-Murata-Electronics-GCM1885C2A4R7BA16D_C3832723.html
footprint CAP-0603 (0603 (1608M) Capacitor)
pins: 1, 2

## GCM1885C2A4R7CA16D
designator C?  Capacitance: 4.7pF  (hidden comment: *)
Capacitor, Ceramic (MLCC), 4.7pF, 100V, SMD 0603; Manufacturer: Murata Electronics; Manufacturer Part Number: GCM1885C2A4R7CA16D; Package Size: 0603; JLCPCB Basic Part: No; JLCPCB Part Number: C2209862; Supplier 1: LCSC; Category: Capacitors - MLCC; Supplier Part Number 1: C2209862; Voltage Rating: 100V; RoHS: Yes; ComponentLink1Description: Datasheet; ComponentLink1URL: https://wmsc.lcsc.com/wmsc/upload/file/pdf/v2/lcsc/2401271620_Murata-Electronics-GCM1885C2A4R7CA16D_C2209862.pdf; ComponentLink2Description: JLCPCB Part URL; ComponentLink2URL: https://jlcpcb.com/partdetail/C2209862; ComponentLink3Description: LCSC Part URL; ComponentLink3URL: https://lcsc.com/product-detail/Multilayer-Ceramic-Capacitors-MLCC---SMD-SMT_Murata-Electronics-Murata-Electronics-GCM1885C2A4R7CA16D_C2209862.html
footprint CAP-0603 (0603 (1608M) Capacitor)
pins: 1, 2

## GCM1885C2A6R8DA16D
designator C?  Capacitance: 6.8pF  (hidden comment: *)
Capacitor, Ceramic (MLCC), 6.8pF, 100V, SMD 0603; Manufacturer: Murata Electronics; Manufacturer Part Number: GCM1885C2A6R8DA16D; Package Size: 0603; JLCPCB Basic Part: No; JLCPCB Part Number: C2212439; Supplier 1: LCSC; Category: Capacitors - MLCC; Supplier Part Number 1: C2212439; Voltage Rating: 100V; RoHS: Yes; ComponentLink1Description: Datasheet; ComponentLink1URL: https://wmsc.lcsc.com/wmsc/upload/file/pdf/v2/lcsc/2308111605_Murata-Electronics-GCM1885C2A6R8DA16D_C2212439.pdf; ComponentLink2Description: JLCPCB Part URL; ComponentLink2URL: https://jlcpcb.com/partdetail/C2212439; ComponentLink3Description: LCSC Part URL; ComponentLink3URL: https://lcsc.com/product-detail/Multilayer-Ceramic-Capacitors-MLCC---SMD-SMT_Murata-Electronics-Murata-Electronics-GCM1885C2A6R8DA16D_C2212439.html
footprint CAP-0603 (0603 (1608M) Capacitor)
pins: 1, 2

## GCM1885C2A100JA16D
designator C?  Capacitance: 10pF  (hidden comment: *)
Capacitor, Ceramic (MLCC), 10pF, ±5%, 100V, C0G, ±5%, SMD 0603; Manufacturer: Murata Electronics; Manufacturer Part Number: GCM1885C2A100JA16D; Package Size: 0603; JLCPCB Basic Part: No; JLCPCB Part Number: C126575; Supplier 1: LCSC; Category: Capacitors - MLCC; Supplier Part Number 1: C126575; Tolerance: ±5%; Voltage Rating: 100V; Temperature Coefficient: C0G; RoHS: Yes; ComponentLink1Description: Datasheet; ComponentLink1URL: https://wmsc.lcsc.com/wmsc/upload/file/pdf/v2/lcsc/1810311133_Murata-Electronics-GCM1885C2A100JA16D_C126575.pdf; ComponentLink2Description: JLCPCB Part URL; ComponentLink2URL: https://jlcpcb.com/partdetail/C126575; ComponentLink3Description: LCSC Part URL; ComponentLink3URL: https://lcsc.com/product-detail/Multilayer-Ceramic-Capacitors-MLCC---SMD-SMT_Murata-Electronics-Murata-Electronics-GCM1885C2A100JA16D_C126575.html
footprint CAP-0603 (0603 (1608M) Capacitor)
pins: 1, 2

## GCM1885C2A100JA16J
designator C?  Capacitance: 10pF  (hidden comment: *)
Capacitor, Ceramic (MLCC), 10pF, ±5%, 100V, C0G, ±5%, SMD 0603; Manufacturer: Murata Electronics; Manufacturer Part Number: GCM1885C2A100JA16J; Package Size: 0603; JLCPCB Basic Part: No; JLCPCB Part Number: C1852380; Supplier 1: LCSC; Category: Capacitors - MLCC; Supplier Part Number 1: C1852380; Tolerance: ±5%; Voltage Rating: 100V; Temperature Coefficient: C0G; RoHS: Yes; ComponentLink1Description: Datasheet; ComponentLink1URL: https://wmsc.lcsc.com/wmsc/upload/file/pdf/v2/lcsc/2308111602_Murata-Electronics-GCM1885C2A100JA16J_C1852380.pdf; ComponentLink2Description: JLCPCB Part URL; ComponentLink2URL: https://jlcpcb.com/partdetail/C1852380; ComponentLink3Description: LCSC Part URL; ComponentLink3URL: https://lcsc.com/product-detail/Multilayer-Ceramic-Capacitors-MLCC---SMD-SMT_Murata-Electronics-Murata-Electronics-GCM1885C2A100JA16J_C1852380.html
footprint CAP-0603 (0603 (1608M) Capacitor)
pins: 1, 2

## GCM1885C2A101FA16D
designator C?  Capacitance: 100pF  (hidden comment: *)
Capacitor, Ceramic (MLCC), 100pF, ±1%, 100V, C0G, ±1%, SMD 0603; Manufacturer: Murata Electronics; Manufacturer Part Number: GCM1885C2A101FA16D; Package Size: 0603; JLCPCB Basic Part: No; JLCPCB Part Number: C527967; Supplier 1: LCSC; Category: Capacitors - MLCC; Supplier Part Number 1: C527967; Tolerance: ±1%; Voltage Rating: 100V; Temperature Coefficient: C0G; RoHS: Yes; ComponentLink1Description: Datasheet; ComponentLink1URL: https://wmsc.lcsc.com/wmsc/upload/file/pdf/v2/lcsc/2206101416_Murata-Electronics-GCM1885C2A101FA16D_C527967.pdf; ComponentLink2Description: JLCPCB Part URL; ComponentLink2URL: https://jlcpcb.com/partdetail/C527967; ComponentLink3Description: LCSC Part URL; ComponentLink3URL: https://lcsc.com/product-detail/Multilayer-Ceramic-Capacitors-MLCC---SMD-SMT_Murata-Electronics-Murata-Electronics-GCM1885C2A101FA16D_C527967.html
footprint CAP-0603 (0603 (1608M) Capacitor)
pins: 1, 2

## GCM1885C2A101JA16D
designator C?  Capacitance: 100pF  (hidden comment: *)
Capacitor, Ceramic (MLCC), 100pF, ±5%, 100V, C0G, ±5%, SMD 0603; Manufacturer: Murata Electronics; Manufacturer Part Number: GCM1885C2A101JA16D; Package Size: 0603; JLCPCB Basic Part: No; JLCPCB Part Number: C126576; Supplier 1: LCSC; Category: Capacitors - MLCC; Supplier Part Number 1: C126576; Tolerance: ±5%; Voltage Rating: 100V; Temperature Coefficient: C0G; RoHS: Yes; ComponentLink1Description: Datasheet; ComponentLink1URL: https://wmsc.lcsc.com/wmsc/upload/file/pdf/v2/lcsc/1810311120_Murata-Electronics-GCM1885C2A101JA16D_C126576.pdf; ComponentLink2Description: JLCPCB Part URL; ComponentLink2URL: https://jlcpcb.com/partdetail/C126576; ComponentLink3Description: LCSC Part URL; ComponentLink3URL: https://lcsc.com/product-detail/Multilayer-Ceramic-Capacitors-MLCC---SMD-SMT_Murata-Electronics-Murata-Electronics-GCM1885C2A101JA16D_C126576.html
footprint CAP-0603 (0603 (1608M) Capacitor)
pins: 1, 2

## GCM1885C2A102FA16D
designator C?  Capacitance: 1nF  (hidden comment: *)
Capacitor, Ceramic (MLCC), 1nF, ±1%, 100V, ±1%, SMD 0603; Manufacturer: Murata Electronics; Manufacturer Part Number: GCM1885C2A102FA16D; Package Size: 0603; JLCPCB Basic Part: No; JLCPCB Part Number: C2219251; Supplier 1: LCSC; Category: Capacitors - MLCC; Supplier Part Number 1: C2219251; Tolerance: ±1%; Voltage Rating: 100V; RoHS: Yes; ComponentLink1Description: Datasheet; ComponentLink1URL: https://wmsc.lcsc.com/wmsc/upload/file/pdf/v2/lcsc/2104021641_Murata-Electronics-GCM1885C2A102FA16D_C2219251.pdf; ComponentLink2Description: JLCPCB Part URL; ComponentLink2URL: https://jlcpcb.com/partdetail/C2219251; ComponentLink3Description: LCSC Part URL; ComponentLink3URL: https://lcsc.com/product-detail/Multilayer-Ceramic-Capacitors-MLCC---SMD-SMT_Murata-Electronics-Murata-Electronics-GCM1885C2A102FA16D_C2219251.html
footprint CAP-0603 (0603 (1608M) Capacitor)
pins: 1, 2

## GCM1885C2A102JA16D
designator C?  Capacitance: 1nF  (hidden comment: *)
Capacitor, Ceramic (MLCC), 1nF, ±5%, 100V, C0G, ±5%, SMD 0603; Manufacturer: Murata Electronics; Manufacturer Part Number: GCM1885C2A102JA16D; Package Size: 0603; JLCPCB Basic Part: No; JLCPCB Part Number: C437457; Supplier 1: LCSC; Category: Capacitors - MLCC; Supplier Part Number 1: C437457; Tolerance: ±5%; Voltage Rating: 100V; Temperature Coefficient: C0G; RoHS: Yes; ComponentLink1Description: Datasheet; ComponentLink1URL: https://wmsc.lcsc.com/wmsc/upload/file/pdf/v2/lcsc/2304140030_Murata-Electronics-GCM1885C2A102JA16D_C437457.pdf; ComponentLink2Description: JLCPCB Part URL; ComponentLink2URL: https://jlcpcb.com/partdetail/C437457; ComponentLink3Description: LCSC Part URL; ComponentLink3URL: https://lcsc.com/product-detail/Multilayer-Ceramic-Capacitors-MLCC---SMD-SMT_Murata-Electronics-Murata-Electronics-GCM1885C2A102JA16D_C437457.html
footprint CAP-0603 (0603 (1608M) Capacitor)
pins: 1, 2

## GCM1885C2A120JA16D
designator C?  Capacitance: 12pF  (hidden comment: *)
Capacitor, Ceramic (MLCC), 12pF, ±5%, 100V, C0G, ±5%, SMD 0603; Manufacturer: Murata Electronics; Manufacturer Part Number: GCM1885C2A120JA16D; Package Size: 0603; JLCPCB Basic Part: No; JLCPCB Part Number: C701298; Supplier 1: LCSC; Category: Capacitors - MLCC; Supplier Part Number 1: C701298; Tolerance: ±5%; Voltage Rating: 100V; Temperature Coefficient: C0G; RoHS: Yes; ComponentLink1Description: Datasheet; ComponentLink1URL: https://wmsc.lcsc.com/wmsc/upload/file/pdf/v2/lcsc/2304140030_Murata-Electronics-GCM1885C2A120JA16D_C701298.pdf; ComponentLink2Description: JLCPCB Part URL; ComponentLink2URL: https://jlcpcb.com/partdetail/C701298; ComponentLink3Description: LCSC Part URL; ComponentLink3URL: https://lcsc.com/product-detail/Multilayer-Ceramic-Capacitors-MLCC---SMD-SMT_Murata-Electronics-Murata-Electronics-GCM1885C2A120JA16D_C701298.html
footprint CAP-0603 (0603 (1608M) Capacitor)
pins: 1, 2

## GCM1885C2A121FA16D
designator C?  Capacitance: 120pF  (hidden comment: *)
Capacitor, Ceramic (MLCC), 120pF, ±1%, 100V, C0G, ±1%, SMD 0603; Manufacturer: Murata Electronics; Manufacturer Part Number: GCM1885C2A121FA16D; Package Size: 0603; JLCPCB Basic Part: No; JLCPCB Part Number: C1864338; Supplier 1: LCSC; Category: Capacitors - MLCC; Supplier Part Number 1: C1864338; Tolerance: ±1%; Voltage Rating: 100V; Temperature Coefficient: C0G; RoHS: Yes; ComponentLink1Description: Datasheet; ComponentLink1URL: https://wmsc.lcsc.com/wmsc/upload/file/pdf/v2/lcsc/2201271800_Murata-Electronics-GCM1885C2A121FA16D_C1864338.pdf; ComponentLink2Description: JLCPCB Part URL; ComponentLink2URL: https://jlcpcb.com/partdetail/C1864338; ComponentLink3Description: LCSC Part URL; ComponentLink3URL: https://lcsc.com/product-detail/Multilayer-Ceramic-Capacitors-MLCC---SMD-SMT_Murata-Electronics-Murata-Electronics-GCM1885C2A121FA16D_C1864338.html
footprint CAP-0603 (0603 (1608M) Capacitor)
pins: 1, 2

## GCM1885C2A150JA16D
designator C?  Capacitance: 15pF  (hidden comment: *)
Capacitor, Ceramic (MLCC), 15pF, ±5%, 100V, C0G, ±5%, SMD 0603; Manufacturer: Murata Electronics; Manufacturer Part Number: GCM1885C2A150JA16D; Package Size: 0603; JLCPCB Basic Part: No; JLCPCB Part Number: C388905; Supplier 1: LCSC; Category: Capacitors - MLCC; Supplier Part Number 1: C388905; Tolerance: ±5%; Voltage Rating: 100V; Temperature Coefficient: C0G; RoHS: Yes; ComponentLink1Description: Datasheet; ComponentLink1URL: https://wmsc.lcsc.com/wmsc/upload/file/pdf/v2/lcsc/1912111437_Murata-Electronics-GCM1885C2A150JA16D_C388905.pdf; ComponentLink2Description: JLCPCB Part URL; ComponentLink2URL: https://jlcpcb.com/partdetail/C388905; ComponentLink3Description: LCSC Part URL; ComponentLink3URL: https://lcsc.com/product-detail/Multilayer-Ceramic-Capacitors-MLCC---SMD-SMT_Murata-Electronics-Murata-Electronics-GCM1885C2A150JA16D_C388905.html
footprint CAP-0603 (0603 (1608M) Capacitor)
pins: 1, 2

## GCM1885C2A151FA16D
designator C?  Capacitance: 150pF  (hidden comment: *)
Capacitor, Ceramic (MLCC), 150pF, ±1%, 100V, ±1%, SMD 0603; Manufacturer: Murata Electronics; Manufacturer Part Number: GCM1885C2A151FA16D; Package Size: 0603; JLCPCB Basic Part: No; JLCPCB Part Number: C2176758; Supplier 1: LCSC; Category: Capacitors - MLCC; Supplier Part Number 1: C2176758; Tolerance: ±1%; Voltage Rating: 100V; RoHS: Yes; ComponentLink1Description: Datasheet; ComponentLink1URL: https://wmsc.lcsc.com/wmsc/upload/file/pdf/v2/lcsc/2202040830_Murata-Electronics-GCM1885C2A151FA16D_C2176758.pdf; ComponentLink2Description: JLCPCB Part URL; ComponentLink2URL: https://jlcpcb.com/partdetail/C2176758; ComponentLink3Description: LCSC Part URL; ComponentLink3URL: https://lcsc.com/product-detail/Multilayer-Ceramic-Capacitors-MLCC---SMD-SMT_Murata-Electronics-Murata-Electronics-GCM1885C2A151FA16D_C2176758.html
footprint CAP-0603 (0603 (1608M) Capacitor)
pins: 1, 2

## GCM1885C2A151JA16D
designator C?  Capacitance: 150pF  (hidden comment: *)
Capacitor, Ceramic (MLCC), 150pF, ±5%, 100V, C0G, ±5%, SMD 0603; Manufacturer: Murata Electronics; Manufacturer Part Number: GCM1885C2A151JA16D; Package Size: 0603; JLCPCB Basic Part: No; JLCPCB Part Number: C126577; Supplier 1: LCSC; Category: Capacitors - MLCC; Supplier Part Number 1: C126577; Tolerance: ±5%; Voltage Rating: 100V; Temperature Coefficient: C0G; RoHS: Yes; ComponentLink1Description: Datasheet; ComponentLink1URL: https://wmsc.lcsc.com/wmsc/upload/file/pdf/v2/lcsc/1810311120_Murata-Electronics-GCM1885C2A151JA16D_C126577.pdf; ComponentLink2Description: JLCPCB Part URL; ComponentLink2URL: https://jlcpcb.com/partdetail/C126577; ComponentLink3Description: LCSC Part URL; ComponentLink3URL: https://lcsc.com/product-detail/Multilayer-Ceramic-Capacitors-MLCC---SMD-SMT_Murata-Electronics-Murata-Electronics-GCM1885C2A151JA16D_C126577.html
footprint CAP-0603 (0603 (1608M) Capacitor)
pins: 1, 2

## GCM1885C2A152JA16D
designator C?  Capacitance: 1.5nF  (hidden comment: *)
Capacitor, Ceramic (MLCC), 1.5nF, ±5%, 100V, C0G, ±5%, SMD 0603; Manufacturer: Murata Electronics; Manufacturer Part Number: GCM1885C2A152JA16D; Package Size: 0603; JLCPCB Basic Part: No; JLCPCB Part Number: C388906; Supplier 1: LCSC; Category: Capacitors - MLCC; Supplier Part Number 1: C388906; Tolerance: ±5%; Voltage Rating: 100V; Temperature Coefficient: C0G; RoHS: Yes; ComponentLink1Description: Datasheet; ComponentLink1URL: https://wmsc.lcsc.com/wmsc/upload/file/pdf/v2/lcsc/2304140030_Murata-Electronics-GCM1885C2A152JA16D_C388906.pdf; ComponentLink2Description: JLCPCB Part URL; ComponentLink2URL: https://jlcpcb.com/partdetail/C388906; ComponentLink3Description: LCSC Part URL; ComponentLink3URL: https://lcsc.com/product-detail/Multilayer-Ceramic-Capacitors-MLCC---SMD-SMT_Murata-Electronics-Murata-Electronics-GCM1885C2A152JA16D_C388906.html
footprint CAP-0603 (0603 (1608M) Capacitor)
pins: 1, 2
